# Altium footprint library ALL.PcbLib: 385 footprints (part 5 of 25)
Each footprint in its own frame and in the unit in brackets; x right, y up, seen from the top. Pads: shape width x height; smd on the part's side, far side on the other; paste and mask are expansions set on the pad; w line width, h text height; cw(c..) or ccw(c..) is an arc to the next point about the centre after c.
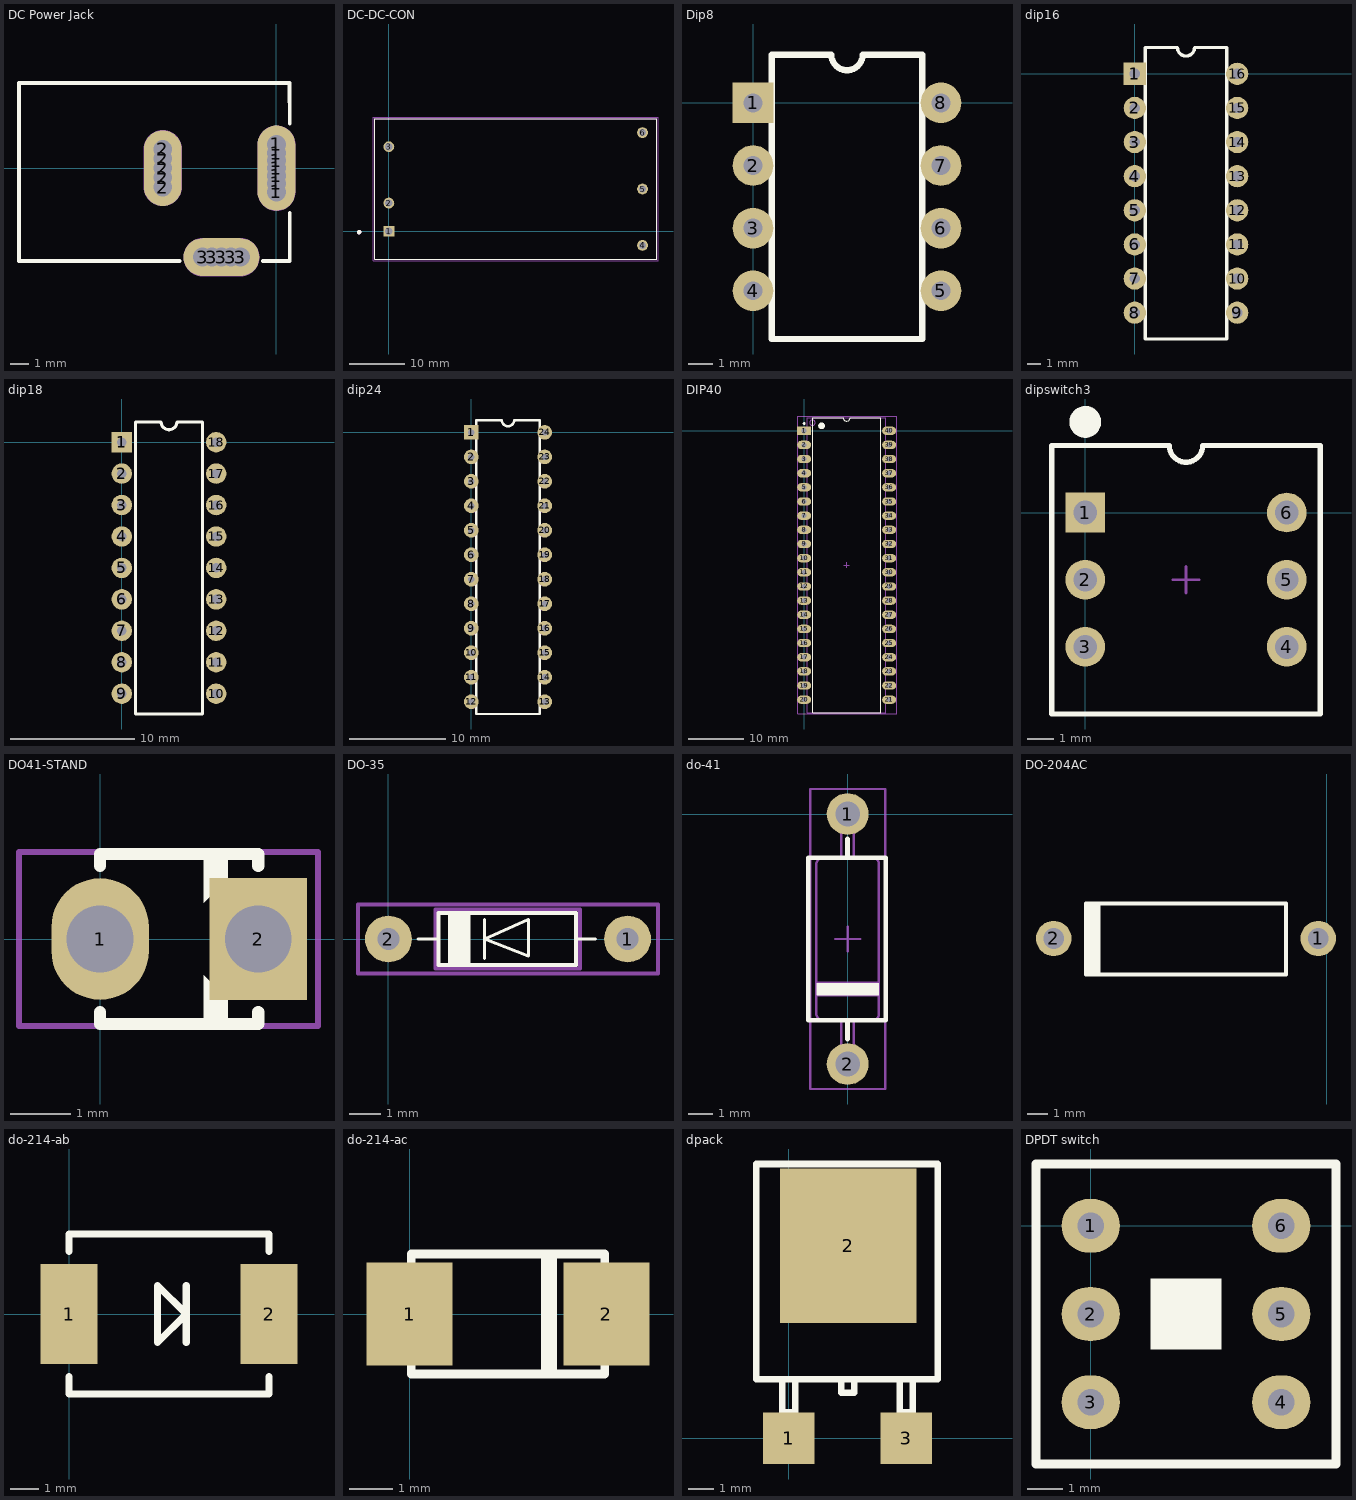
[diagram p4: the footprints below, top view; thin cyan lines are the x and y axes]

## DC Power Jack [mm]
pads (17):
  round 1.5 hole 1: 1(0,-1.25) 1(0,-0.8) 1(0,-0.4) 1(0,0.4) 1(0,0.8) 1(0,1.25) 2(-6,-1) 2(-6,1) 2(-6,-0.5) 2(-6,0.5) 3(-3.9,-4.7) 3(-3.4,-4.7) 3(-2.4,-4.7) 3(-1.9,-4.7)
  oval 2x4.5 hole 1: 1(0,0)
  oval 2x4 hole 1: 2(-6,0)
  oval 4x2 hole 1: 3(-2.9,-4.7)
Top Overlay:
  lines w0.2: -5.1,-4.9 -13.59,-4.9 -13.59,4.5 0.7,4.5 0.7,2.35 ; -0.7,-4.9 0.7,-4.9 0.7,-2.35
Mechanical 1:
  lines w1: -6,-1 -6,1 ; -3.9,-4.7 -1.9,-4.7 ; 0,-1.25 0,1.25
Mechanical 2:
  lines w2.016: -6,-1 -6,1 ; -3.9,-4.7 -1.9,-4.7 ; 0,-1.25 0,1.25
3D body "User Library-PJ-002AH.STEP": height 11.05, standoff -3.45, extent -13.68,-4.935 0.72,4.465

## DC-DC-CON [mm]
pads (6):
  rect 1.95x1.95 hole 1.3: 1(0,0)
  round 1.95 hole 1.3: 2(0,5.08) 3(0,15.24) 4(45.72,-2.54) 5(45.72,7.62) 6(45.72,17.78)
Top Overlay:
  circle w0.4: c-5.36,-0.16 r0.2
  lines w0.127: -2.54,-5.08 48.26,-5.08 48.26,20.32 -2.54,20.32 -2.54,-5.08
Mechanical 13:
  circle w0.4: c-5.36,-0.16 r0.2
  lines w0.127: -2.54,-5.08 48.26,-5.08 48.26,20.32 -2.54,20.32 -2.54,-5.08
Mechanical 15:
  lines w0.05: -2.79,-5.33 48.51,-5.33 48.51,20.57 -2.79,20.57 -2.79,-5.33
3D body "RP40-2412DFR.STEP": height 10.2, standoff -5.6, extent -2.794,-5.207 48.006,20.193

## Dip8 [mil]
pads (8):
  rect 65x65 hole 30: 1(0,0)
  round 65 hole 30: 2(0,-100) 3(0,-200) 4(0,-300) 5(300,-300) 6(300,-200) 7(300,-100) 8(300,0)
Top Overlay:
  lines w10: 30,-377 270,-377 270,77 175,77 cw(c150,77) 125,77 30,77 30,-377
3D body "SW3DPS-DIP8-DEFAULT.step": height 165, standoff -105, extent -5,-375 305,75

## dip16 [mil]
pads (16):
  rect 65x65 hole 30: 1(0,0)
  round 65 hole 30: 2(0,-100) 3(0,-200) 4(0,-300) 5(0,-400) 6(0,-500) 7(0,-600) 8(0,-700) 9(300,-700) 10(300,-600) 11(300,-500) 12(300,-400) 13(300,-300) 14(300,-200) 15(300,-100) 16(300,0)
Top Overlay:
  lines w10: 30,-777 270,-777 270,77 175,77 cw(c150,77) 125,77 30,77 30,-777
3D body "SW3dPS-DIP16-300.step": height 200, standoff -98.03, extent -4.92,-743.7 304.92,43.7

## dip18 [mil]
pads (18):
  rect 65x65 hole 30: 1(0,0)
  round 65 hole 30: 2(0,-100) 3(0,-200) 4(0,-300) 5(0,-400) 6(0,-500) 7(0,-600) 8(0,-700) 9(0,-800) 10(300,-800) 11(300,-700) 12(300,-600) 13(300,-500) 14(300,-400) 15(300,-300) 16(300,-200) 17(300,-100) 18(300,0)
Top Overlay:
  lines w10: 43.7,-864.57 256.3,-864.57 256.3,64.57 175,64.57 cw(c150,64.57) 125,64.57 43.7,64.57 43.7,-864.57
3D body "SW3dPS-DIP18-300.step": height 200, standoff -98.03, extent -4.92,-852.56 304.92,52.56

## dip24 [mil]
pads (24):
  rect 60x60 hole 25: 1(0,0)
  round 60 hole 25: 2(0,-100) 3(0,-200) 4(0,-300) 5(0,-400) 6(0,-500) 7(0,-600) 8(0,-700) 9(0,-800) 10(0,-900) 11(0,-1000) 12(0,-1100) 13(300,-1100) 14(300,-1000) 15(300,-900) 16(300,-800) 17(300,-700) 18(300,-600) 19(300,-500) 20(300,-400) 21(300,-300) 22(300,-200) 23(300,-100) 24(300,0)
Top Overlay:
  lines w10: 20,-1150 280,-1150 280,50 175,50 cw(c150,50) 125,50 20,50 20,-1150
Mechanical 1:
  drawing of 288 lines, arcs and shapes, not listed
3D body: height 75, standoff 65, extent 5,-25 15,25
3D body: height 0, standoff 0, extent -5,-25 -5,25
3D body: height 75, standoff 35, extent -5,-25 5,25
3D body: height 35, standoff -75, extent -5,-9 5,9
3D body: height 100, standoff 30, extent 15,-1155 285,55
3D body: height 115, standoff 100, extent 15,-1155 285,55
3D body: height 35, standoff -75, extent -5,-109 5,-91
3D body: height 75, standoff 35, extent -5,-125 5,-75
3D body: height 75, standoff 65, extent 5,-125 15,-75
3D body: height 35, standoff -75, extent -5,-209 5,-191
3D body: height 75, standoff 35, extent -5,-225 5,-175
3D body: height 75, standoff 65, extent 5,-225 15,-175
3D body: height 35, standoff -75, extent -5,-309 5,-291
3D body: height 75, standoff 35, extent -5,-325 5,-275
3D body: height 75, standoff 65, extent 5,-325 15,-275
3D body: height 35, standoff -75, extent -5,-409 5,-391
3D body: height 75, standoff 35, extent -5,-425 5,-375
3D body: height 75, standoff 65, extent 5,-425 15,-375
3D body: height 35, standoff -75, extent -5,-509 5,-491
3D body: height 75, standoff 35, extent -5,-525 5,-475
3D body: height 75, standoff 65, extent 5,-525 15,-475
3D body: height 35, standoff -75, extent -5,-609 5,-591
3D body: height 75, standoff 35, extent -5,-625 5,-575
3D body: height 75, standoff 65, extent 5,-625 15,-575
3D body: height 35, standoff -75, extent -5,-709 5,-691
3D body: height 75, standoff 35, extent -5,-725 5,-675
3D body: height 75, standoff 65, extent 5,-725 15,-675
3D body: height 35, standoff -75, extent -5,-809 5,-791
3D body: height 75, standoff 35, extent -5,-825 5,-775
3D body: height 75, standoff 65, extent 5,-825 15,-775
3D body: height 35, standoff -75, extent -5,-909 5,-891
3D body: height 75, standoff 35, extent -5,-925 5,-875
3D body: height 75, standoff 65, extent 5,-925 15,-875
3D body: height 35, standoff -75, extent -5,-1009 5,-991
3D body: height 75, standoff 35, extent -5,-1025 5,-975
3D body: height 75, standoff 65, extent 5,-1025 15,-975
3D body: height 35, standoff -75, extent -5,-1109 5,-1091
3D body: height 75, standoff 35, extent -5,-1125 5,-1075
3D body: height 75, standoff 65, extent 5,-1125 15,-1075
3D body: height 35, standoff -75, extent 295,-1109 305,-1091
3D body: height 75, standoff 35, extent 295,-1125 305,-1075
3D body: height 75, standoff 65, extent 285,-1125 295,-1075
3D body: height 35, standoff -75, extent 295,-1009 305,-991
3D body: height 75, standoff 35, extent 295,-1025 305,-975
3D body: height 75, standoff 65, extent 285,-1025 295,-975
3D body: height 35, standoff -75, extent 295,-909 305,-891
3D body: height 75, standoff 35, extent 295,-925 305,-875
3D body: height 75, standoff 65, extent 285,-925 295,-875
3D body: height 35, standoff -75, extent 295,-809 305,-791
3D body: height 75, standoff 35, extent 295,-825 305,-775
3D body: height 75, standoff 65, extent 285,-825 295,-775
3D body: height 35, standoff -75, extent 295,-709 305,-691
3D body: height 75, standoff 35, extent 295,-725 305,-675
3D body: height 75, standoff 65, extent 285,-725 295,-675
3D body: height 35, standoff -75, extent 295,-609 305,-591
3D body: height 75, standoff 35, extent 295,-625 305,-575
3D body: height 75, standoff 65, extent 285,-625 295,-575
3D body: height 35, standoff -75, extent 295,-509 305,-491
3D body: height 75, standoff 35, extent 295,-525 305,-475
3D body: height 75, standoff 65, extent 285,-525 295,-475
3D body: height 35, standoff -75, extent 295,-409 305,-391
3D body: height 75, standoff 35, extent 295,-425 305,-375
3D body: height 75, standoff 65, extent 285,-425 295,-375
3D body: height 35, standoff -75, extent 295,-309 305,-291
3D body: height 75, standoff 35, extent 295,-325 305,-275
3D body: height 75, standoff 65, extent 285,-325 295,-275
3D body: height 35, standoff -75, extent 295,-209 305,-191
3D body: height 75, standoff 35, extent 295,-225 305,-175
3D body: height 75, standoff 65, extent 285,-225 295,-175
3D body: height 35, standoff -75, extent 295,-109 305,-91
3D body: height 75, standoff 35, extent 295,-125 305,-75
3D body: height 75, standoff 65, extent 285,-125 295,-75
3D body: height 35, standoff -75, extent 295,-9 305,9
3D body: height 75, standoff 35, extent 295,-25 305,25
3D body: height 75, standoff 65, extent 285,-25 295,25

## DIP40 [mm]
pads (40):
  rect 2.5x1.5 hole 0.9: 1(0,0)
  oval 2.5x1.5 hole 0.9: 2(0,-2.54) 3(0,-5.08) 4(0,-7.62) 5(0,-10.16) 6(0,-12.7) 7(0,-15.24) 8(0,-17.78) 9(0,-20.32) 10(0,-22.86) 11(0,-25.4) 12(0,-27.94) 13(0,-30.48) 14(0,-33.02) 15(0,-35.56) 16(0,-38.1) 17(0,-40.64) 18(0,-43.18) 19(0,-45.72) 20(0,-48.26) 21(15.24,-48.26) 22(15.24,-45.72) 23(15.24,-43.18) 24(15.24,-40.64) 25(15.24,-38.1) 26(15.24,-35.56) 27(15.24,-33.02) 28(15.24,-30.48) 29(15.24,-27.94) 30(15.24,-25.4) 31(15.24,-22.86) 32(15.24,-20.32) 33(15.24,-17.78) 34(15.24,-15.24) 35(15.24,-12.7) 36(15.24,-10.16) 37(15.24,-7.62) 38(15.24,-5.08) 39(15.24,-2.54) 40(15.24,0)
Top Overlay:
  circle w0.25: c0,1.3 r0.125
  circle w0.6: c3.12,0.87 r0.3
  lines w0.2: 1.52,-50.63 1.52,2.37 6.985,2.37 ccw(c7.62,2.37) 8.255,2.37 13.72,2.37 13.72,-50.63 1.52,-50.63
Mechanical 13:
  circle w0.1: c1.47,1.445 r0.5
  lines w0.1: 0.57,-50.605 0.57,2.345 14.67,2.345 14.67,-50.605 0.57,-50.605
Mechanical 15:
  lines w0.1: 7.12,-24.13 8.12,-24.13 ; 7.62,-24.63 7.62,-23.63
  lines w0.15: -1.18,-50.83 16.62,-50.83 16.62,2.57 -1.18,2.57 -1.18,-50.83
3D body "User Library-DIP40-600-with-chip-Type2.STEP": height 7.89, standoff -3.27, extent -1.08,-50.26 16.52,2

## dipswitch3 [mm]
pads (6):
  rect 1.5x1.5 hole 0.9: 1(0,0)
  round 1.5 hole 0.9: 2(0,-2.54) 3(0,-5.08) 4(7.62,-5.08) 5(7.62,-2.54) 6(7.62,0)
Top Overlay:
  circle w0.6: c0,3.429 r0.3
  lines w0.2: -1.27,-7.62 8.89,-7.62 8.89,2.54 4.445,2.54 cw(c3.81,2.54) 3.175,2.54 -1.27,2.54 -1.27,-7.62
Mechanical 15:
  lines w0.1: 3.31,-2.54 4.31,-2.54 ; 3.81,-3.04 3.81,-2.04
3D body "dipsw3.step": height 8.5, standoff -3.8, extent -1.08,-7.48 8.7,2.4

## DO41-STAND [mm]
pads (2):
  oval 1.6x2 hole 1.1: 1(0,0)
  rect 1.6x2 hole 1.1: 2(2.6,0)
Top Overlay:
  region: 2.1,1.4 2.1,1 1.7,0.6 1.7,1.4
  region: 2.1,-1.4 2.1,-1 1.7,-0.6 1.7,-1.4
  lines w0.2: 0,-1.2 0,-1.4 2.6,-1.4 2.6,-1.2 ; 0,1.2 0,1.4 2.6,1.4 2.6,1.2
Mechanical 14:
  lines w0.1: -1.335,-1.429 3.586,-1.429 3.586,1.429 -1.335,1.429 -1.335,-1.429
3D body "1N4007_Stand.STEP": height 7.39, standoff -1, extent -1.3,-1.333 2.967,1.333

## DO-35 [mm]
pads (2):
  round 1.5 hole 0.7: 1(7.65,0) 2(0,0)
Top Overlay:
  rectangle: 1.9,-0.85 2.625,0.85
  lines w0.1: 0.95,0 1.6,0 ; 3.075,-0.625 3.075,0.625 ; 6,0 6.625,0 ; 3.075,0 4.475,0.625 4.475,-0.55 3.075,0
  lines w0.127: 1.6,-0.825 6,-0.825 6,0.825 1.6,0.825 1.6,-0.825
Mechanical 13:
  lines w0.127: 1.5,-0.95 1.5,0.95 6.125,0.95 6.125,-0.95 1.5,-0.95
Mechanical 15:
  lines w0.127: -0.975,-1.1 8.625,-1.1 8.625,1.1 -0.975,1.1 -0.975,-1.1
3D body "User Library-DO-35-300mil.STEP": height 1.96, standoff -2.45, extent -0.275,-0.96 7.905,0.96

## do-41 [mm]
pads (2):
  round 1.7 hole 1: 1(0,0) 2(0,-10.16)
Top Overlay:
  region: -1.27,-6.858 -1.27,-7.366 1.27,-7.366 1.27,-6.858
  lines w0.2: 0,-9.144 0,-8.382 ; 0,-1.778 0,-1.016 ; -1.6,-8.382 1.549,-8.382 1.549,-1.778 -1.6,-1.778 -1.6,-8.382
Mechanical 13:
  lines w0.1: -1.27,-7.366 1.27,-7.366 ; -1.27,-6.858 1.27,-6.858 ; -0.254,-10.287 ccw(c-0.127,-10.287) -0.127,-10.414 0.127,-10.414 ccw(c0.127,-10.287) 0.254,-10.287 ; -0.254,-10.277 -0.254,-10.033 ; -0.254,-8.384 -0.254,-10.033 ; -0.254,-1.776 -0.254,-0.127 ; -0.254,0.117 -0.254,-0.127 ; -0.254,0.127 cw(c-0.127,0.127) -0.127,0.254 0.127,0.254 cw(c0.127,0.127) 0.254,0.127 ; 0.254,-10.277 0.254,-10.033 ; 0.254,-8.384 0.254,-10.033 ; 0.254,-1.776 0.254,-0.127 ; 0.254,0.117 0.254,-0.127 ; -0.254,-10.033 0.254,-10.033 ; -0.254,-0.127 0.254,-0.127 ; -1.27,-8.128 ccw(c-1.016,-8.128) -1.016,-8.382 1.016,-8.382 ccw(c1.016,-8.128) 1.27,-8.128 1.27,-2.032 ccw(c1.016,-2.032) 1.016,-1.778 -1.016,-1.778 ccw(c-1.016,-2.032) -1.27,-2.032 -1.27,-8.128
Mechanical 15:
  lines w0.1: -0.508,-5.08 0,-5.08 ; 0,-5.588 0,-5.08 ; 0,-4.572 0,-5.08 ; 0.508,-5.08 0,-5.08 ; -1.524,-11.176 -1.524,1.016 1.524,1.016 1.524,-11.176 -1.524,-11.176
3D body "DO-41.STEP": height 3.35, standoff -2, extent -1.346,-10.488 1.354,0.532

## DO-204AC [mm]
pads (2):
  round 1.7 hole 1: 1(-0.406,8.712) 2(-13.106,8.712)
Top Overlay:
  region: -10.856,10.389 -11.656,10.389 -11.656,6.985 -10.856,6.985
  lines w0.2: -11.556,6.985 -1.956,6.985 -1.956,10.389 -11.556,10.389
3D body "DO-15-50.step": height 3.53, standoff -2, extent -13.606,6.965 0.144,10.453

## do-214-ab [mm]
pads (2):
  rect 2x3.5 smd: 1(0,0) 2(7,0)
Top Overlay:
  lines w0.254: 0,-2.2 0,-2.8 3.5,-2.8 7,-2.8 7,-2.2 ; 0,2.2 0,2.8 3.5,2.8 7,2.8 7,2.2 ; 4.1,-1 4.1,0 ; 4.1,1 4.1,0 ; 4.1,0 3.1,1 3.1,-1 4.1,0
3D body "DO-214AB.step": height 2.4, standoff 0.03, extent -0.565,-3 7.565,3.1

## do-214-ac [mm]
pads (2):
  rect 2x2.4 smd: 1(0,0) 2(4.572,0)
Top Overlay:
  rectangle: 3.048,-1.397 3.429,1.397
  lines w0.203: 0.036,-1.143 0.036,-1.397 4.536,-1.397 4.536,-1.143 ; 0.036,1.143 0.036,1.397 4.536,1.397 4.536,1.143
3D body "User Library-DIOM5528X26.STEP": height 2.6, standoff 0.03, extent -0.623,-1.321 4.877,1.479

## dpack [mm]
pads (3):
  rect 2x2 smd: 1(0,0) 3(4.572,0)
  rect 5.3x6 smd: 2(2.311,7.493)
Top Overlay:
  lines w0.254: -0.254,2.286 -0.254,1.016 0.254,1.016 0.254,2.286 ; 2.032,2.286 2.032,1.778 2.54,1.778 2.54,2.286 ; 4.318,2.286 4.318,1.016 4.826,1.016 4.826,2.286 ; -1.27,2.294 -1.27,10.676 5.791,10.676 5.791,2.294 -1.27,2.294
3D body "User Library-DPAK_TO-252AA_.STEP": height 2.42, standoff 0.02, extent -1.081,0.379 5.653,10.479

## DPDT switch [mil]
pads (6):
  oval 65x60 hole 30: 1(0,0) 2(0,-98.43) 3(0,-196.85) 4(212.6,-196.85) 5(212.6,-98.43) 6(212.6,0)
Top Overlay:
  rectangle: 66.93,-137.8 145.67,-59.06
  lines w10: -61.02,-265.75 273.62,-265.75 273.62,68.9 -61.02,68.9 -61.02,-265.75
3D body "DPDT.STEP": height 559.06, standoff -129.92, extent -61.02,-265.75 273.62,68.9